# Altium footprint library Evaluation Boards - Embedded - MCU, DSP.PcbLib: 1 footprints
Each footprint in its own frame and in the unit in brackets; x right, y up, seen from the top. Pads: shape width x height; smd on the part's side, far side on the other; paste and mask are expansions set on the pad; w line width, h text height; cw(c..) or ccw(c..) is an arc to the next point about the centre after c.
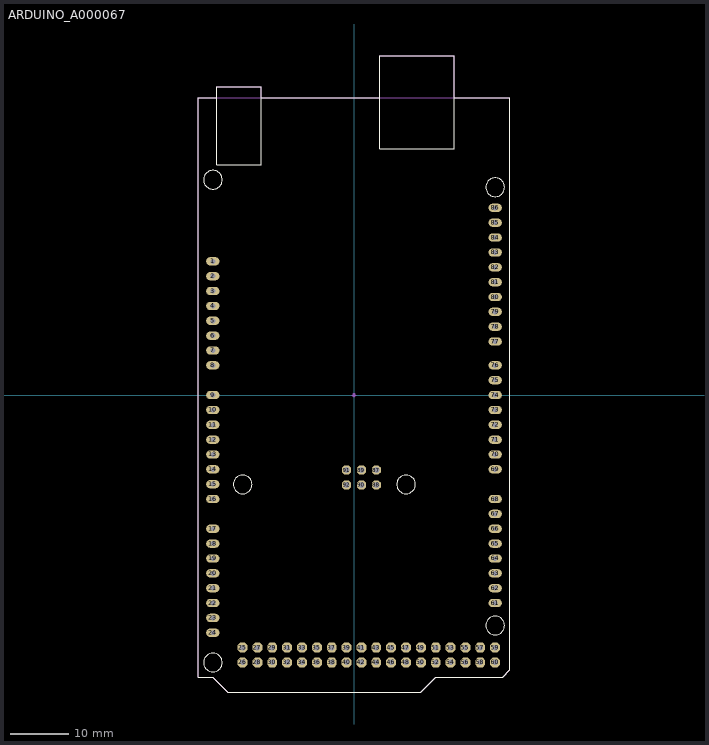
[diagram p0: the footprint, top view; thin cyan lines are the x and y axes]

## ARDUINO_A000067 [mil]
pads (92):
  oval 89.6x56 hole 33.46: 1(-950,900) 2(-950,800) 3(-950,700) 4(-950,600) 5(-950,500) 6(-950,400) 7(-950,300) 8(-950,200) 9(-950,0) 10(-950,-100) 11(-950,-200) 12(-950,-300) 13(-950,-400) 14(-950,-500) 15(-950,-600) 16(-950,-700) 17(-950,-900) 18(-950,-1000) 19(-950,-1100) 20(-950,-1200) 21(-950,-1300) 22(-950,-1400) 23(-950,-1500) 24(-950,-1600) 61(950,-1400) 62(950,-1300) 63(950,-1200) 64(950,-1100) 65(950,-1000) 66(950,-900) 67(950,-800) 68(950,-700) 69(950,-500) 70(950,-400) 71(950,-300) 72(950,-200) 73(950,-100) 74(950,0) 75(950,100) 76(950,200) 77(950,360) 78(950,460) 79(950,560) 80(950,660) 81(950,760) 82(950,860) 83(950,960) 84(950,1060) 85(950,1160) 86(950,1260)
  oct 66x66 hole 37.4: 25(-750,-1700) 26(-750,-1800) 27(-650,-1700) 28(-650,-1800) 29(-550,-1700) 30(-550,-1800) 31(-450,-1700) 32(-450,-1800) 33(-350,-1700) 34(-350,-1800) 35(-250,-1700) 36(-250,-1800) 37(-150,-1700) 38(-150,-1800) 39(-50,-1700) 40(-50,-1800) 41(50,-1700) 42(50,-1800) 43(150,-1700) 44(150,-1800) 45(250,-1700) 46(250,-1800) 47(350,-1700) 48(350,-1800) 49(450,-1700) 50(450,-1800) 51(550,-1700) 52(550,-1800) 53(650,-1700) 54(650,-1800) 55(750,-1700) 56(750,-1800) 57(850,-1700) 58(850,-1800) 59(950,-1700) 60(950,-1800)
  oct 61.02x61.02 hole 40: 87(150,-505) 88(150,-605) 89(50,-505) 90(50,-605) 91(-50,-505) 92(-50,-605)
Top Overlay:
  circle w3.94: c950.5,1398.99 r62.99
  circle w3.94: c350.5,-601.01 r62.99
  circle w3.94: c950.5,-1551.01 r62.99
  circle w3.94: c-949.5,-1801.01 r62.99
  circle w3.94: c-749.5,-601.01 r62.99
  circle w3.94: c-949.5,1448.99 r63.01
  lines w3.94: -925,2000 -1050,2000 -1050,-1900 -950,-1900 -850,-2000 450,-2000 550,-1900 1000,-1900 1050,-1850 1050,2000 675,2000 ; -625,2000 175,2000 ; -925,1550 -625,1550 -625,2075 -925,2075 -925,1550 ; 175,1658.46 675,1658.46 675,2283.46 175,2283.46 175,1658.46
Mechanical 1:
  lines w0.98: -1050,-1900 -950,-1900 -850,-2000 450,-2000 550,-1900 1000,-1900 1050,-1850 1050,2000 -1050,2000 -1050,-1900
Mechanical 13:
  lines w0.98: -1050,-1900 -950,-1900 -850,-2000 450,-2000 550,-1900 1000,-1900 1050,-1850 1050,2000 675,2000 675,2283.46 175,2283.46 175,2000 -625,2000 -625,2075 -925,2075 -925,2000 -1050,2000 -1050,-1900
Mechanical 15:
  circle w1.97: c0,0 r9.84
  lines w1.97: -13.78,0 13.78,0 ; 0,-13.78 0,13.78
  lines w3.94: -1050,-1900 -950,-1900 ; -1050,-1900 -1050,2000 ; -1050,-1900 -950,-1900 ; -1050,-1900 -1050,2000 ; -1050,2000 1050,2000 ; -1050,2000 1050,2000 ; -950,-1900 -850,-2000 ; -950,-1900 -850,-2000 ; -850,-2000 450,-2000 ; -850,-2000 450,-2000 ; 450,-2000 550,-1900 ; 450,-2000 550,-1900 ; 550,-1900 1000,-1900 ; 550,-1900 1000,-1900 ; 1000,-1900 1050,-1850 ; 1000,-1900 1050,-1850 ; 1050,-1850 1050,2000 ; 1050,-1850 1050,2000
3D body "Arduino MEGA 2560 R3.SLDPRT": height -19.29, standoff -594.49, extent -1055.11,-1980 1055.12,2285.75
3D body "DS1021-1x10S61_B.step": height 98.43, standoff -358.27, extent 900,310.01 1000,1310.01
3D body "DS1021-1x8S61_B.step": height 118.11, standoff -338.58, extent 900,-550 1000,250
3D body "DS1021-1x8S61_B.step": height 118.11, standoff -338.58, extent 900,-1450 1000,-650
3D body "DS1021-1x8S61_B.step": height 118.11, standoff -338.58, extent -1000,-1650 -900,-850
3D body "DS1021-1x8S61_B.step": height 118.11, standoff -338.58, extent -1000,-750 -900,50
3D body "DS1021-1x8S61_B.step": height 118.11, standoff -338.58, extent -1000,150 -900,950
3D body "DS1021-2x18S61_B.step": height 118.11, standoff -338.58, extent -799.99,-1848.43 1000.01,-1651.57
3D body "DS1023-2x3SF11_B.step": height 118.11, standoff -334.65, extent -115.74,-653.42 215.75,-456.57